# Altium integrated library AnalogDevices.IntLib: 130 symbols (part 4 of 4) (continued)
## ADuM5201CRWZ (continued)
text: A/B; 5201

## CMP04FS
designator D?
CMP04FS Quad Low Power Precision Comparator; Manufacturer: Analog Devices; Type: Микросхема; SymAuthor: Москалец (Юрганов); Name: *; TU/GOST: *; BCPId: *; Package: 14-Lead SOIC, R14/SO-14; Rem: *; ManufacturerPartNumber: CMP04FS
footprint SOIC127P600X175-14N (SOIC, 14-Leads, Body 8.7x3.9mm, Pitch 1.27mm, IPC Medium Density)
part A pins: 2 OUT1 (out) "OUTPUT1", 4 IN1- (in) "INVERTING INPUT1", 5 IN1+ (in) "NONINVERTING INPUT1"
part B pins: 1 OUT2 (out) "OUTPUT2", 6 IN2- (in) "INVERTING INPUT2", 7 IN2+ (in) "NONINVTRTING INPUT2"
part C pins: 3 V+ (power) "POSITIVE SUPPLY", 8 IN3- (in) "INVERTING INPUT3", 9 IN3+ (in) "NONINVERTING INPUT3", 12 GND (power) "GROUND SUBSTRATE", 14 OUT3 (out) "OUTPUT3"
part D pins: 10 IN4- (in) "INVERTING INPUT4", 11 IN4+ (in) "NONINVERTING INPUT4", 13 OUT4 (out) "OUTPUT4"

## HMC194AMS8E
designator D?  (value not drawn)
RF Switch; Manufacturer: Analog Devices; Type: Микросхема; ManufacturerPartNumber: HMC194AMS8E
footprint TSOP65P490X110-8N (TSOP, 8-Leads, Body 3,00x3,00mm, Pitch 0,65mm, IPC Medium Density)
pins: 1 A (io), 2 B (io), 3 RFС (io), 4 NC (io), 5 RF1 (io), 6 GND (power), 7 GND (power), 8 RF2 (io)
text: SW; HMC194

## HMC646LP2
designator D?  (value not drawn)
GaAs MMIC 40W FAILSAFE  SWITCH, 0.1 - 2.1 GHz; Manufacturer: Analog Devices; ManufacturerPartNumber: HMC646LP2; Type: Микросхема; Package: DFN 2x2mm
footprint DFN200X200X100_HS-7N-85x145 (DFN, 6-Leads, Body 2,00x2,00mm, Pitch 0,65mm, Thermal Pad 0,80x1,40mm, IPC Medium Density)
pins: 1 Tx (power), 2 N/C, 3 ACG (power), 4 Rx (power), 5 Vctl (power), 6 RFC (io), EPAD GND (power) hidden to GND
text: SW; HMC646; LP2

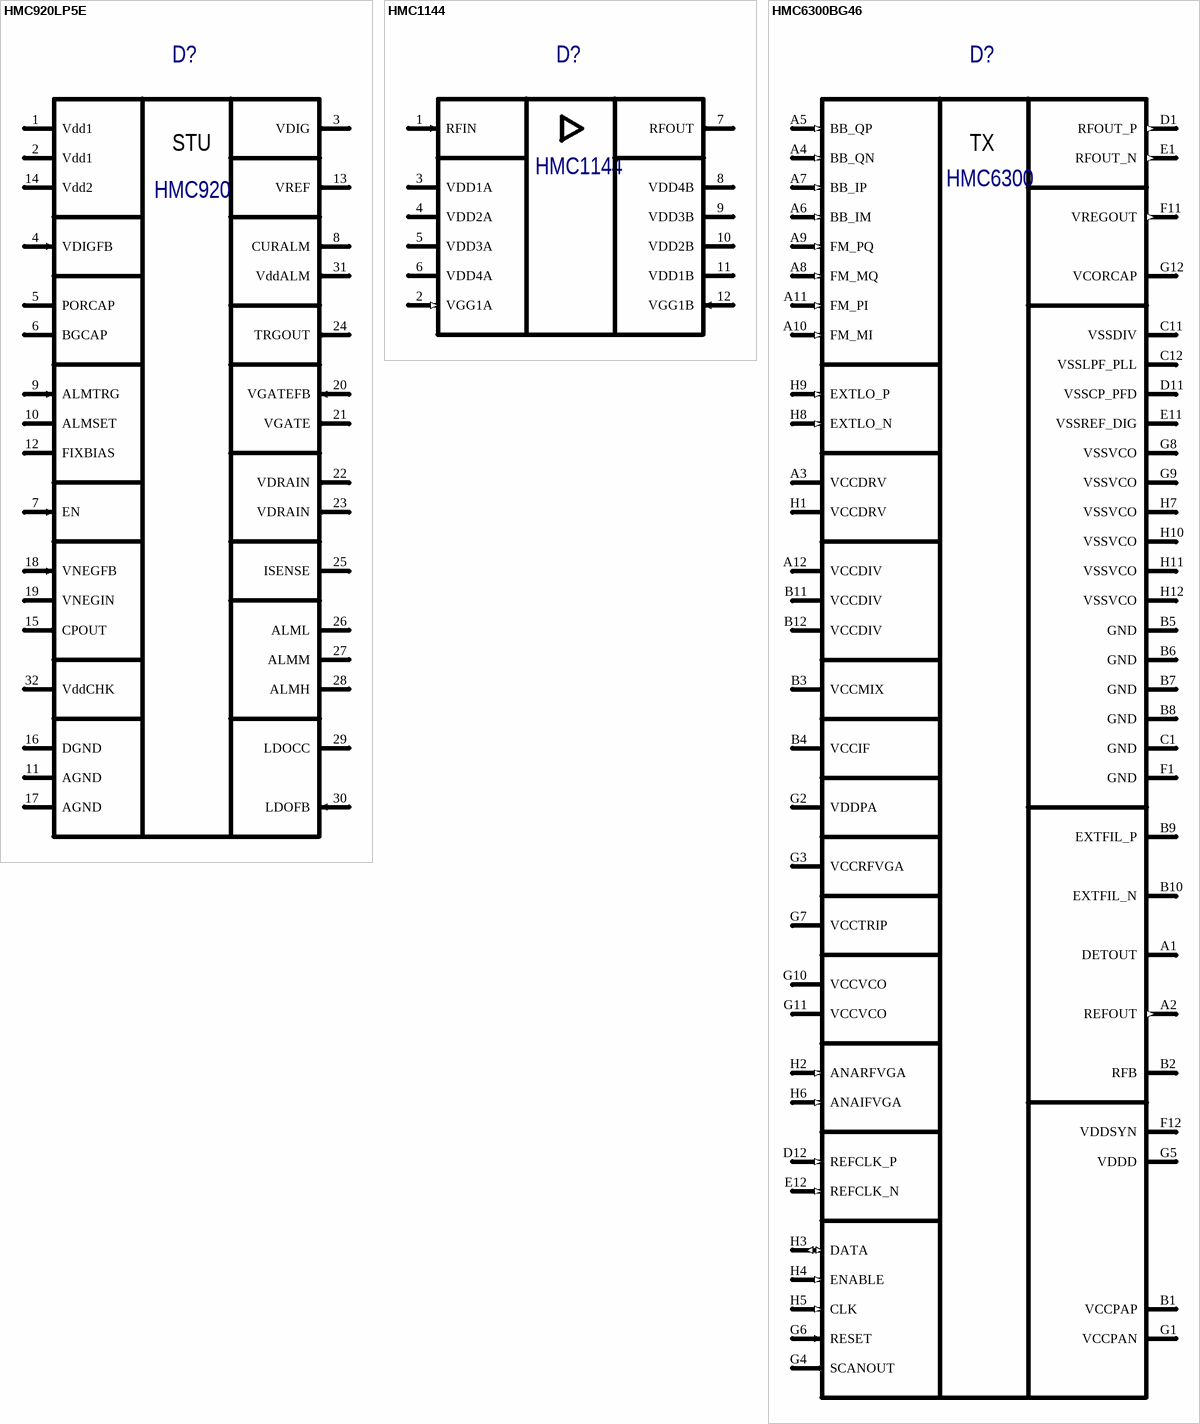
[diagram p19: symbols HMC920LP5E to HMC6300BG46]

## HMC920LP5E
designator D?  (value not drawn)
Active bias controller; Manufacturer: Analog Devices; Type: Микросхема; SymAuthor: Таран А. Н.; ManufacturerPartNumber: HMC920LP5E; Package: 5,0х5,0х0,9 мм QFN
footprint QFN50P500X500X100_HS380x380-33N (QFN, 32-Leads, Body 5,00x5,00mm, Pitch 0,50mm, Thermal Pad 3,80x3,80mm, IPC Medium Density)
pins: 1 Vdd1 (power) "Bias supply Pin.", 2 Vdd1 (power) "Bias supply Pin.", 3 VDIG (out) "3.5V LDO output for internal use.", 4 VDIGFB (in) "Feedback node for VDIG LDO.", 5 PORCAP "External capacitor for power-on-reset signal.", 6 BGCAP "External capacitor of bandgap output.", 7 EN (in) "Enable pin.", 8 CURALM (out) "Over/under current alarm.", 9 ALMTRG (in) "Dummy alarm trigger signal.", 10 ALMSET "Alarm delay duration set resistor.", 11 AGND (power) "Analog ground domain (GND).", 12 FIXBIAS "Bias current set resistor.", 13 VREF (out) "1.5V reference voltage.", 14 Vdd2 (power) "Bias supply for negative voltage generator.", 15 CPOUT (out) "Negative voltage generator charge pump output.", 16 DGND (power) "Digital ground domain (DGND).", 17 AGND (power) "Analog ground domain (GND).", 18 VNEGFB (in) "Feedback (Control) pin for Negative Voltage Generator", 19 VNEGIN (power) "Negative input to the chip.", 20 VGATEFB (in) "Control pin for VGATEFB.", 21 VGATE (out) "Gate Control pin for external amplifier.", 22 VDRAIN (out) "Drain voltage.", 23 VDRAIN (out) "Drain voltage.", 24 TRGOUT (out) "Trigger out signal.", 25 ISENSE "Bias current of the external amplifier adjust resistor pin.", 26 ALML "the threshold value for under current alarm set resistor.", 27 ALMM "The threshold value for under current alarm set resistor.", 28 ALMH "The threshold value for under current alarm set resistor.", 29 LDOCC (power) "High voltage LDO output pin.", 30 LDOFB (in) "Feedback pin of the VDRAIN LDO.", 31 VddALM (out) "Generates an active LOW signal if Vdd1 drops below 3.5V.", 32 VddCHK "Should be left floating for regular operation.", EPAD GND PAD hidden to GND "Analog ground (AGND)."
text: STU; HMC920

## HMC1144
designator D?  (value not drawn)
35 GHz to 70 GHz, GaAs, pHEMT, MMIC, Medium Power Amplifier; Manufacturer: Analog Devices; SymAuthor: Таран А. Н.; Type: Микросхема; ManufacturerPartNumber: HMC1144; Package: 12-Pad Bare Die [CHIP]
footprint C-12-2
pins: 1 RFIN (in) "RF Input.", 2 VGG1A (in) "Gate Control Pad for Alternate Bias Configuration.", 3 VDD1A (power) "Drain Bias Voltage Pads for the Amplifier.", 4 VDD2A (power) "Drain Bias Voltage Pads for the Amplifier.", 5 VDD3A (power) "Drain Bias Voltage Pads for the Amplifier.", 6 VDD4A (power) "Drain Bias Voltage Pads for the Amplifier.", 7 RFOUT (out) "RF Output.", 8 VDD4B (power) "Drain Bias Voltage Pads for Alternate Bias Configuration.", 9 VDD3B (power) "Drain Bias Voltage Pads for Alternate Bias Configuration.", 10 VDD2B (power) "Drain Bias Voltage Pads for Alternate Bias Configuration.", 11 VDD1B (power) "Drain Bias Voltage Pads for Alternate Bias Configuration.", 12 VGG1B (in) "Gate Control Pad for the Amplifier."

## HMC6300BG46
designator D?  (value not drawn)
60 GHz Millimeterwave Transmitter, 57 GHz to 64 GHz; Manufacturer: Analog Devices; SymAuthor: Таран А. Н.; Type: Микросхема; ManufacturerPartNumber: HMC6300BG46; Package: 65-Ball Wafer Level Ball Grid Array [WLBGA] (BF-65-1)
footprint BGA65C50P8X12_600X400X815 (BGA, 65-Leads, Body 6x4mmx0,815mm, Pitch 0,50mm)
pins: A1 DETOUT (power) "Detector Output (0.6 V dc to 2.6 V dc).", A2 REFOUT (out) "Detector Reference Output (0.6 V dc).", A3 VCCDRV (power) "Driver Power Supply (2.7 V dc).", A4 BB_QN (in) "Quadrature Negative Baseband Input.", A5 BB_QP (in) "Quadrature Positive Baseband Input.", A6 BB_IM (in) "In-Phase Negative Baseband Input.", A7 BB_IP (in) "In-Phase Positive Baseband Input.", A8 FM_MQ (in) "FSK Negative (Minus) Quadrature Input.", A9 FM_PQ (in) "FSK Positive Quadrature Input.", A10 FM_MI (in) "FSK Negative (Minus) In-Phase Input.", A11 FM_PI (in) "FSK Positive In-Phase Input.", A12 VCCDIV (power) "Divider Power Supply (2.7 V dc).", B1 VCCPAP (power) "Power Amplifier Power Supply (4.0 V dc).", B2 RFB "Detector Circuit Feedback.", B3 VCCMIX (power) "Mixer Power Supply (2.7 V dc).", B4 VCCIF (power) "IF Power Supply (2.7 V dc).", B5 GND (power) "Analog Ground Connect.", B6 GND (power) "Analog Ground Connect.", B7 GND (power) "Analog Ground Connect.", B8 GND (power) "Analog Ground Connect.", B9 EXTFIL_P "External PLL Filter (Positive).", B10 EXTFIL_N "External PLL Filter (Negative).", B11 VCCDIV (power) "Divider Power Supply (2.7 V dc).", B12 VCCDIV (power) "Divider Power Supply (2.7 V dc).", C1 GND (power) "Analog Ground Connect.", C11 VSSDIV (power) "Digital Ground for the Synthesizer.", C12 VSSLPF_PLL (power) "Digital Ground for Synthesizer.", D1 RFOUT_P (out) "Radio Frequency Output (Positive).", D11 VSSCP_PFD (power) "Digital Ground for Synthesizer.", D12 REFCLK_P (in) "External Reference Clock (Positive).", E1 RFOUT_N (out) "Radio Frequency Output (Negative).", E11 VSSREF_DIG (power) "Digital Ground for Synthesizer.", E12 REFCLK_N (in) "External Reference Clock (Negative).", EPAD1 GND (power) hidden to GND "GROUND AREA", EPAD2 GND (power) hidden to GND "GROUND AREA", EPAD3 GND (power) hidden to GND "GROUND AREA", EPAD4 GND (power) hidden to GND "GROUND AREA", EPAD5 GND (power) hidden to GND "GROUND AREA", F1 GND (power) "Analog Ground Connect.", F11 VREGOUT (out) "VCO Regulator Output.", F12 VDDSYN (power) "Synthesizer Power Supply (1.3 V dc).", G1 VCCPAN (power) "Power Amplifier Power Supply (4.0 V dc).", G2 VDDPA (power) "Power Amplifier Power Supply (2.7 V dc).", G3 VCCRFVGA (power) "RF VGA Power Supply (2.7 V dc).", G4 SCANOUT (out) "Serial Digital Interface Output (1.2 V CMOS).", G5 VDDD (power) "Digital Circuits Power Supply (1.3 V dc).", G6 RESET (in) "Serial Digital Interface Reset (1.2 V CMOS).", G7 VCCTRIP (power) "Tripler Power Supply (2.7 V dc).", G8 VSSVCO (power) "Digital Ground for the VCO.", G9 VSSVCO (power) "Digital Ground for the VCO.", G10 VCCVCO (power) "VCO Power Supply (2.7 V dc).", G11 VCCVCO (power) "VCO Power Supply (2.7 V dc).", G12 VCORCAP "External Capacitor Connection for the VCO Regulator.", H1 VCCDRV (power) "Driver Power Supply (2.7 V dc).", H2 ANARFVGA (in) "0.1 V to 2.4 V RF VGA Analog Control.", H3 DATA (io) "Serial Digital Interface Data (1.2 V CMOS).", H4 ENABLE (in) "Serial Digital Interface Enable (1.2 V CMOS).", H5 CLK (in) "Serial Digital Interface Clock (1.2 V CMOS).", H6 ANAIFVGA (in) "0.1 V to 2.4 V IF VGA Analog Control.", H7 VSSVCO (power) "Digital Ground for the VCO.", H8 EXTLO_N (in) "External LO (Negative) Input.", H9 EXTLO_P (in) "External LO (Positive) Input.", H10 VSSVCO (power) "Digital Ground for the VCO.", H11 VSSVCO (power) "Digital Ground for the VCO.", H12 VSSVCO (power) "Digital Ground for the VCO."
text: TX; HMC6300

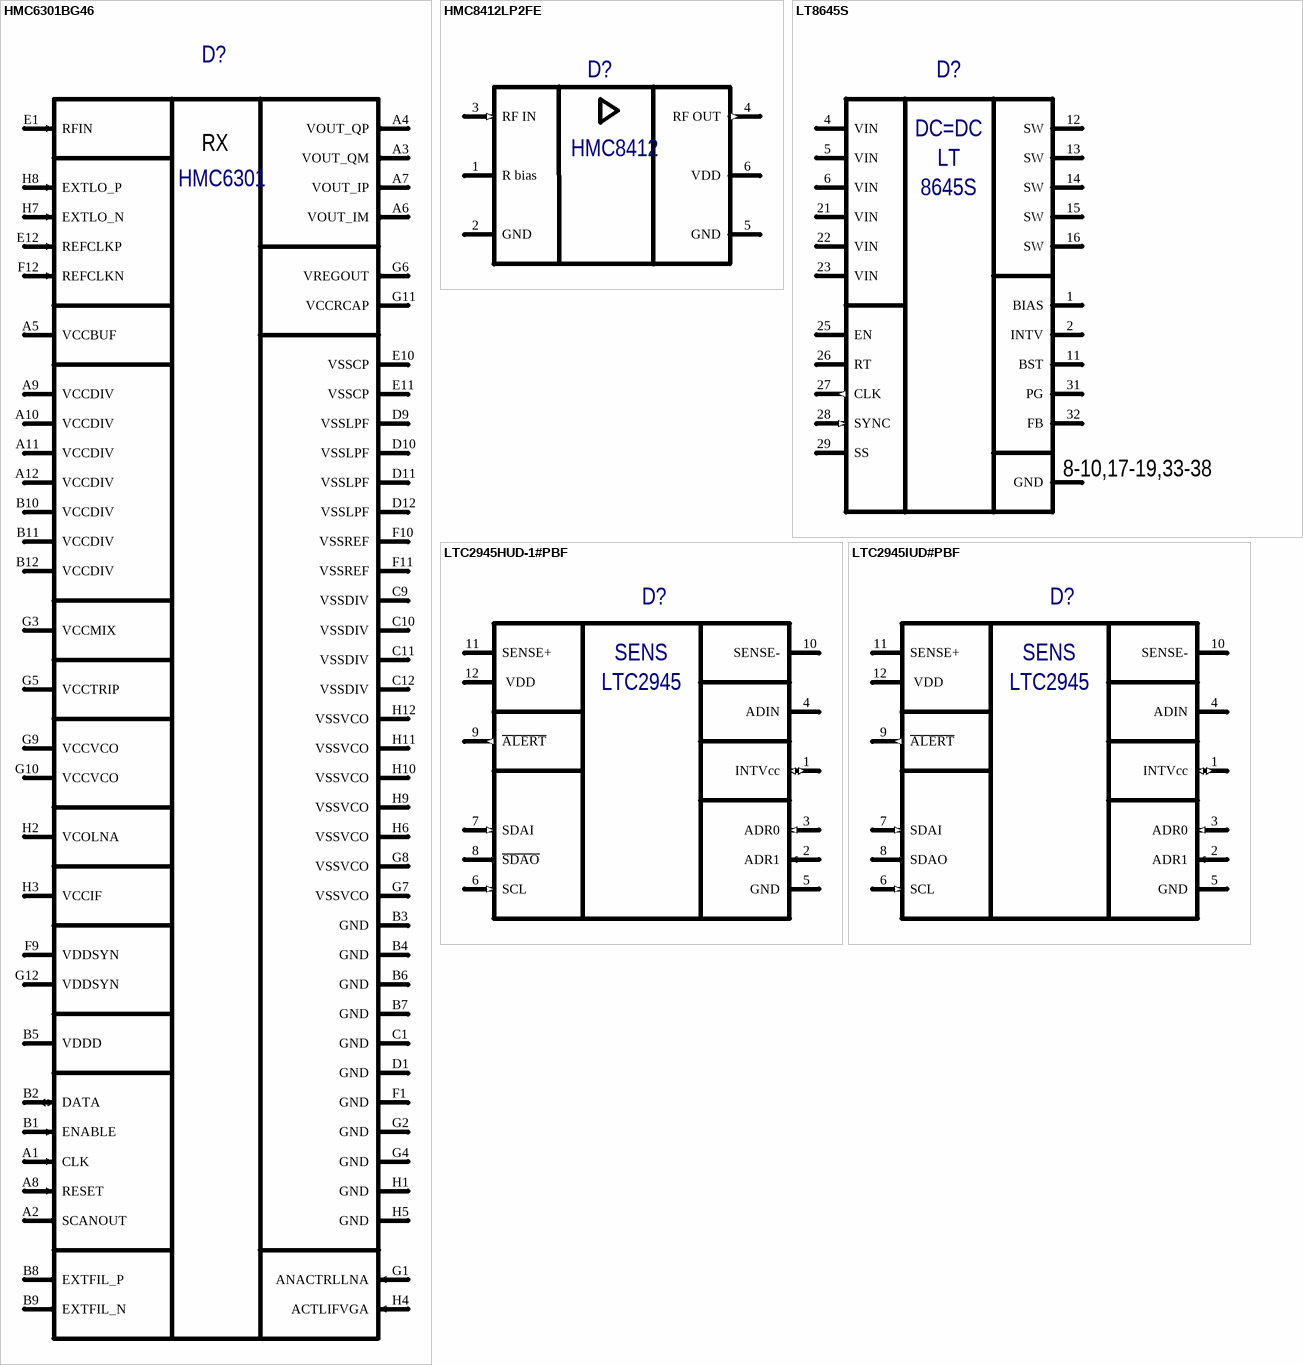
[diagram p20: symbols HMC6301BG46 to LTC2945IUD#PBF]

## HMC6301BG46
designator D?  (value not drawn)
Millimeterwave Receiver, 57 GHz to 64 GHz; Manufacturer: Analog Devices; SymAuthor: Таран А.Н.; Type: Микросхема; ManufacturerPartNumber: HMC6301BG46; Package: 75-Ball WLBGA (BF-75-1)
footprint BGA75C50P8X12_600X400X815 (BGA, 75-Leads, Body 6x4mmx0,815mm, Pitch 0,50mm)
pins: A1 CLK (in) "Serial Digital Interface Clock (1.2 V CMOS).", A2 SCANOUT (out) "Serial Digital Interface Out (1.2 V CMOS).", A3 VOUT_QM (out) "Quadrature Negative Baseband Output.", A4 VOUT_QP (out) "Quadrature Positive Baseband Output.", A5 VCCBUF (power) "Power Supply for the Buffer (2.7 V dc).", A6 VOUT_IM (out) "In-Phase Negative Baseband Output.", A7 VOUT_IP (out) "In-Phase Positive Baseband Output.", A8 RESET (in) "Serial Digital Interface Reset (1.2 V CMOS).", A9 VCCDIV (power) "Power Supply for the Divider (2.7 V dc).", A10 VCCDIV (power) "Power Supply for the Divider (2.7 V dc).", A11 VCCDIV (power) "Power Supply for the Divider (2.7 V dc).", A12 VCCDIV (power) "Power Supply for the Divider (2.7 V dc).", B1 ENABLE (in) "Serial Digital Interface Enable (1.2 V CMOS).", B2 DATA (io) "Serial Digital Interface Data (1.2 V CMOS).", B3 GND (power) "Analog Ground Connect.", B4 GND (power) "Analog Ground Connect.", B5 VDDD (power) "Power Supply for the Digital Circuits (1.3 V dc).", B6 GND (power) "Analog Ground Connect.", B7 GND (power) "Analog Ground Connect.", B8 EXTFIL_P (out) "External PLL Loop Filter (Positive).", B9 EXTFIL_N (out) "External PLL Loop Filter (Positive).", B10 VCCDIV (power) "Power Supply for the Divider (2.7 V dc).", B11 VCCDIV (power) "Power Supply for the Divider (2.7 V dc).", B12 VCCDIV (power) "Power Supply for the Divider (2.7 V dc).", C1 GND (power) "Analog Ground Connect.", C9 VSSDIV (power) "Digital Ground for the Synthesizer Divider.", C10 VSSDIV (power) "Digital Ground for the Synthesizer Divider.", C11 VSSDIV (power) "Digital Ground for the Synthesizer Divider.", C12 VSSDIV (power) "Digital Ground for the Synthesizer Divider.", D1 GND (power) "Analog Ground Connect.", D9 VSSLPF (power) "Digital Ground for the Synthesizer Low-Pass Filter.", D10 VSSLPF (power) "Digital Ground for the Synthesizer Low-Pass Filter.", D11 VSSLPF (power) "Digital Ground for the Synthesizer Low-Pass Filter.", D12 VSSLPF (power) "Digital Ground for the Synthesizer Low-Pass Filter.", E1 RFIN (in) "Radio Frequency Input.", E10 VSSCP (power) "Digital Ground for the Synthesizer Charge Pump.", E11 VSSCP (power) "Digital Ground for the Synthesizer Charge Pump.", E12 REFCLKP (in) "External Reference Clock (Positive).", EPAD1 GND (power) hidden to GND "GROUND AREA", EPAD2 GND (power) hidden to GND "GROUND AREA", EPAD3 GND (power) hidden to GND "GROUND AREA", EPAD4 GND (power) hidden to GND "GROUND AREA", EPAD5 GND (power) hidden to GND "GROUND AREA", EPAD6 GND (power) hidden to GND "GROUND AREA", EPAD7 GND (power) hidden to GND "GROUND AREA", EPAD8 GND (power) hidden to GND "GROUND AREA", F1 GND (power) "Analog Ground Connect.", F9 VDDSYN (power) "Power Supply for the Synthesizer (1.3 V dc).", F10 VSSREF (power) "Digital Ground for the Synthesizer Reference.", F11 VSSREF (power) "Digital Ground for the Synthesizer Reference.", F12 REFCLKN (in) "External Reference Clock (Negative).", G1 ANACTRLLNA (in) "Analog Gain Control for the Low Noise Amplifier.", G2 GND (power) "Analog Ground Connect.", G3 VCCMIX (power) "Power Supply for the Mixer (2.7 V dc).", G4 GND (power) "Analog Ground Connect.", G5 VCCTRIP (power) "Power Supply for the Tripler (2.7 V dc).", G6 VREGOUT (out) "Regulator Output for the Voltage Controlled Oscillator.", G7 VSSVCO (power) "Digital Ground to the Synthesizer Voltage Controlled Oscillator.", G8 VSSVCO (power) "Digital Ground to the Synthesizer Voltage Controlled Oscillator.", G9 VCCVCO (power) "Power Supply for the Voltage Controlled Oscillator (2.7 V dc).", G10 VCCVCO (power) "Power Supply for the Voltage Controlled Oscillator (2.7 V dc).", G11 VCCRCAP "External Capacitor Connection for the Voltage Controlled Oscillator Regulator.", G12 VDDSYN (power) "Power Supply for the Synthesizer (1.3 V dc).", H1 GND (power) "Analog Ground Connect.", H2 VCOLNA (power) "Power Supply for the Low Noise Amplifier (2.8 V dc).", H3 VCCIF (power) "Power Supply for the Intermediate Frequency (2.8 V dc).", H4 ACTLIFVGA (in) "Analog Gain Control for the IF Variable Gain Amplifier.", H5 GND (power) "Analog Ground Connect.", H6 VSSVCO (power) "Digital Ground to the Synthesizer Voltage Controlled Oscillator.", H7 EXTLO_N (in) "External Local Oscillator (Negative) Input.", H8 EXTLO_P (in) "External Local Oscillator (Positive) Input.", H9 VSSVCO (power) "Digital Ground to the Synthesizer Voltage Controlled Oscillator.", H10 VSSVCO (power) "Digital Ground to the Synthesizer Voltage Controlled Oscillator.", H11 VSSVCO (power) "Digital Ground to the Synthesizer Voltage Controlled Oscillator.", H12 VSSVCO (power) "Digital Ground to the Synthesizer Voltage Controlled Oscillator."
text: RX; HMC6301

## HMC8412LP2FE
designator D?  (value not drawn)
Low Noise Amplifier,  0.4 GHz to 11 GHz; Manufacturer: Analog Devices; Type: Микросхема; BCPId: *; Name: *; Package: CP-6-12; ManufacturerPartNumber: HMC8412LP2FE
footprint SON65P200X90_HS-7N (SON, 6-Leads, Body 2,00x2,00mm, Pitch 0,65mm, Thermal Pad 1,60x1mm, IPC Medium Density)
pins: 1 R bias (power) "Current Mirror Bias Resistor Pin", 2 GND (power) "Ground", 3 RF IN (in), 4 RF OUT (out) "RF OUT / Vdd", 5 GND (power), 6 VDD (power), EPAD GND (power) hidden to GND "Paddle"
text: HMC8412

## LT8645S
designator D?, comment LT8645SEV#PBF  (value not drawn)
65V, 8A Synchronous  Step-Down Silent Switcher 2; Manufacturer: Analog Devices; Type: Микросхема; SymAuthor: Блохин В.А,; BCPId: *; Name: *; Package: LQFN 6x4; ManufacturerPartNumber: LT8645SEV#PBF
footprint LQFN50P600X400X94-32N (32-Lead SMD; Body: L=6mm, W=4mm, H=0.94mm; Weight: ~2g)
pins: 1 BIAS (power) "The internal regulator", 2 INTV (power) "Internal 3.4V Regulator Bypass Pin", 3 NC hidden to GND, 4 VIN (power) "V IN pin", 5 VIN (power) "V IN pin", 6 VIN (power) "V IN pin", 7 NC hidden to GND, 8 GND (power) "Ground", 9 GND (power) hidden to GND "Ground", 10 GND (power) hidden to GND "Ground", 11 BST (power) "drive voltage", 12 SW (power) "Power Output", 13 SW (power) "Power Output", 14 SW (power) "Power Output", 15 SW (power) "Power Output", 16 SW (power) "Power Output", 17 GND (power) hidden to GND "Ground", 18 GND (power) hidden to GND "Ground", 19 GND (power) hidden to GND "Ground", 20 NC hidden to GND, 21 VIN (power) "V IN pin", 22 VIN (power) "V IN pin", 23 VIN (power) "V IN pin", 24 NC hidden to GND, 25 EN (power) "shut down", 26 RT (power) "switching frequency", 27 CLK (out) "In pulse-skipping mode", 28 SYNC (in) "operating modes", 29 SS (power) "Soft-Start", 30 GND (power) hidden to GND, 31 PG (power) "power good", 32 FB (power) "feedback", 33 EPAD (power) hidden to GND "Exposed Pad Ground", 34 EPAD (power) hidden to GND "Exposed Pad Ground", 35 EPAD (power) hidden to GND "Exposed Pad Ground", 36 EPAD (power) hidden to GND "Exposed Pad Ground", 37 EPAD (power) hidden to GND "Exposed Pad Ground", 38 EPAD (power) hidden to GND "Exposed Pad Ground", 39 GND (power) hidden to GND, 40 GND (power) hidden to GND, 41 GND (power) hidden to GND, 42 GND (power) hidden to GND
text: DC=DC; LT; 8645S; 8-10,17-19,33-38

## LTC2945HUD-1#PBF
designator D?  (value not drawn)
Wide Range I2C Power Monitor; Manufacturer: Analog Devices; Type: Микросхема; SymAuthor: Гришин Е.; ManufacturerPartNumber: LTC2945HUD-1#PBF; Package: 12-Lead (3mm x 3mm) Plastic QFN
footprint QFN50P300X300X80_HS165X165-13N (QFN, 12-Leads, Body 3,0x3,0mm, Pitch 0,50mm, Thermal Pad 1,65x1,65mm, IPC Medium Density)
pins: 1 INTVcc (io) "Internal Low Voltage Supply Input/Output", 2 ADR1 (in) "I2C Device Adress Inputs", 3 ADR0 (in) "I2C Device Adress Inputs", 4 ADIN "ADC Input", 5 GND (power) "Device Ground", 6 SCL (in) "I2C Bus Clock Input", 7 SDAI (in) "I2C Bus Data Input", 8 ~{SDAO} (out) "I2C Bus Data Output", 9 ~{ALERT} (out) "Fault Alert Output", 10 SENSE- (power) "Current Sense Input. Connect an external sense resistor between SENSE+ and SENSE-", 11 SENSE+ (power) "Supply Voltage and Current Sense Input", 12  VDD (power) "High Voltage Supply Input", EPAD (power) hidden to GND "Exposed Pad connected to GND"
text: SENS; LTC2945

## LTC2945IUD#PBF
designator D?  (value not drawn)
Wide Range I2C Power Monitor; Manufacturer: Analog Devices; Type: Микросхема; SymAuthor: Приходченко А.И.; ManufacturerPartNumber: LTC2945IUD#PBF; Package: 12-Lead (3mm x 3mm) Plastic QFN
footprint QFN50P300X300X80_HS165X165-13N (QFN, 12-Leads, Body 3,0x3,0mm, Pitch 0,50mm, Thermal Pad 1,65x1,65mm, IPC Medium Density)
pins: 1 INTVcc (io) "Internal Low Voltage Supply Input/Output", 2 ADR1 (in) "I2C Device Adress Inputs", 3 ADR0 (in) "I2C Device Adress Inputs", 4 ADIN "ADC Input", 5 GND (power) "Device Ground", 6 SCL (in) "I2C Bus Clock Input", 7 SDAI (in) "I2C Bus Data Input", 8 SDAO (out) "I2C Bus Data Output", 9 ~{ALERT} (out) "Fault Alert Output", 10 SENSE- (power) "Current Sense Input. Connect an external sense resistor between SENSE+ and SENSE-", 11 SENSE+ (power) "Supply Voltage and Current Sense Input", 12  VDD (power) "High Voltage Supply Input", EPAD (power) hidden to GND "Exposed Pad connected to GND"
text: SENS; LTC2945

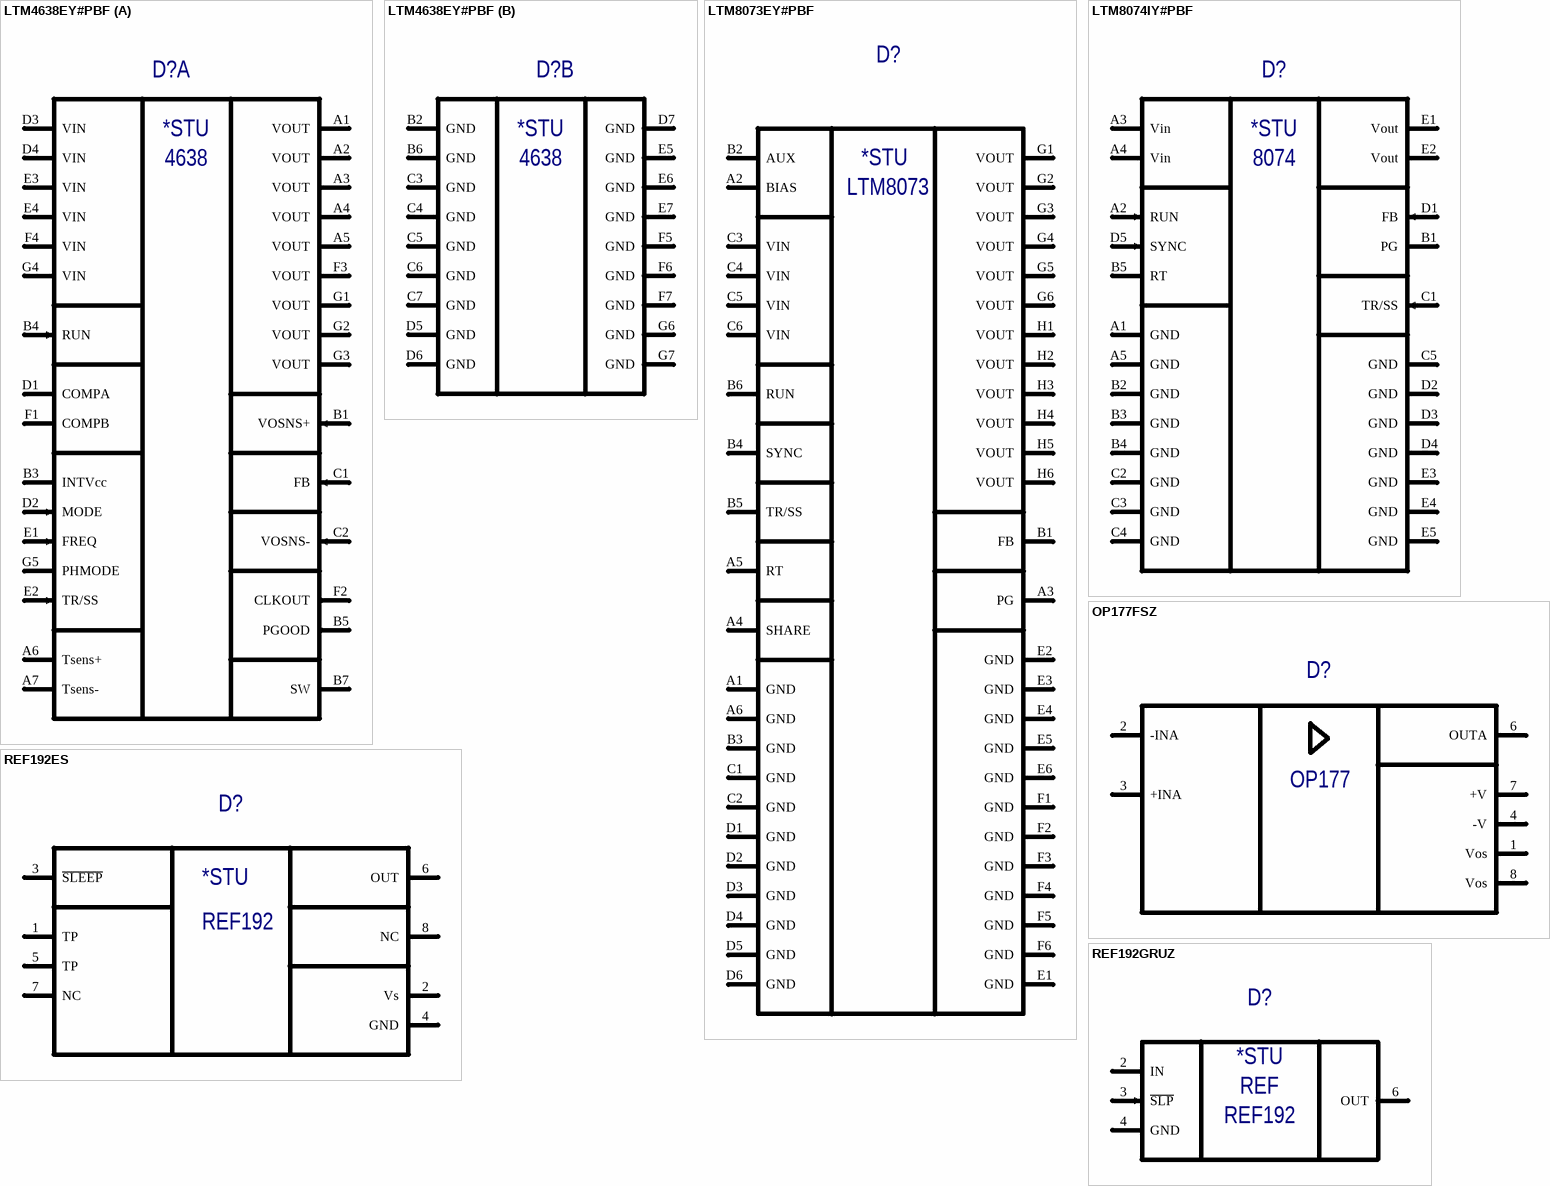
[diagram p21: symbols LTM4638EY#PBF to REF192GRUZ]

## LTM4638EY#PBF
designator D?  (value not drawn)
20Vin, 15A Step-Down DC/DC µModule Regulator; Manufacturer: Linear Technology; Type: Микросхема; SymAuthor: Ерешко П.А.; Package: BGA-49; ManufacturerPartNumber: LTM4638EY#PBF
footprint BGA49C80P7X7_625X625X536 (BGA, 49-Leads, Body 6,25x6,25mmx5,36mm, Pitch 0,80mm)
part A pins: A1 VOUT (power) "Power Output Pins", A2 VOUT (power) "Power Output Pins", A3 VOUT (power) "Power Output Pins", A4 VOUT (power) "Power Output Pins", A5 VOUT (power) "Power Output Pins", A6 Tsens+ "Temperature Monitor", A7 Tsens- "Temperature Monitor", B1 VOSNS+ (in) "Input to the Remote Sense Amplifier", B3 INTVcc (power) "Internal 3.3V LDO", B4 RUN (in) "Run Control Pin", B5 PGOOD (out) "Output Voltage Power Good Indicator", B7 SW "Switching node of the circuit is used for testing purposes", C1 FB (in) "The Negative Input of the Error Amplifier", C2 VOSNS- (in) "Input to the Remote Sense Amplifier", D1 COMPA "Current Control Threshold and Error Amplifier Compensation Point", D2 MODE (in) "Discontinuous Mode Select Pin and External Synchronization Input to Phase Detector", D3 VIN (power) "Power Input Pins", D4 VIN (power) "Power input pins", E1 FREQ (in) "Set the operating frequency", E2 TR/SS (in) "Output Voltage Tracking Pin and Soft-Start", E3 VIN (power) "Power input pins", E4 VIN (power) "Power input pins", F1 COMPB "Internal Loop Compensation Networks", F2 CLKOUT (out) "Output Clock  Signal for PolyPhase Operation", F3 VOUT (power) "Power Output Pins", F4 VIN (power) "Power input pins", G1 VOUT (power) "Power Output Pins", G2 VOUT (power) "Power Output Pins", G3 VOUT (power) "Power Output Pins", G4 VIN (power) "Power input pins", G5 PHMODE "Control Input to the Phase Selector"
part B pins: B2 GND (power) "Power Ground Pins", B6 GND (power) "Power Ground Pins", C3 GND (power) "Power Ground Pins", C4 GND (power) "Power Ground Pins", C5 GND (power) "Power Ground Pins", C6 GND (power) "Power Ground Pins", C7 GND (power) "Power Ground Pins", D5 GND (power) "Power Ground Pins", D6 GND (power) "Power Ground Pins", D7 GND (power) "Power Ground Pins", E5 GND (power) "Power Ground Pins", E6 GND (power) "Power Ground Pins", E7 GND (power) "Power Ground Pins", F5 GND (power) "Power Ground Pins", F6 GND (power) "Power Ground Pins", F7 GND (power) "Power Ground Pins", G6 GND (power) "Power Ground Pins", G7 GND (power) "Power Ground Pins"
part A text: *STU; 4638
part B text: *STU; 4638

## LTM8073EY#PBF
designator D?  (value not drawn)
Стабилизатор напряжений; Manufacturer: Analog Devices; Type: Микросхема; ManufacturerPartNumber: LTM8073EY#PBF; Package: *
footprint BGA48C100P6X8_625X900X352 (BGA, 48-Leads, Body 6,25x9,00mmx3,52mm, Pitch 1,00mm)
pins: A1 GND (power), A2 BIAS, A3 PG, A4 SHARE, A5 RT, A6 GND (power), B1 FB, B2 AUX, B3 GND (power), B4 SYNC, B5 TR/SS, B6 RUN, C1 GND (power), C2 GND (power), C3 VIN (power), C4 VIN (power), C5 VIN (power), C6 VIN, D1 GND (power), D2 GND (power), D3 GND (power), D4 GND (power), D5 GND (power), D6 GND (power), E1 GND (power), E2 GND (power), E3 GND (power), E4 GND (power), E5 GND (power), E6 GND (power), F1 GND (power), F2 GND (power), F3 GND (power), F4 GND (power), F5 GND (power), F6 GND (power), G1 VOUT (power), G2 VOUT (power), G3 VOUT (power), G4 VOUT (power), G5 VOUT (power), G6 VOUT (power), H1 VOUT (power), H2 VOUT (power), H3 VOUT (power), H4 VOUT (power), H5 VOUT (power), H6 VOUT (power)
text: *STU; LTM8073

## LTM8074IY#PBF
designator D?  (value not drawn)
40Vin, 1.2A Silent Switcher µModule Regulator; Manufacturer: Analog Devices; Type: Микросхема; Package: BGA-25; ManufacturerPartNumber: LTM8074IY#PBF
footprint BGA25C65P5X5_400X400X198 (BGA, 25-Leads, 5 columns X 5 rows, Body 4,00x4,00mmx1,98mm, Pitch 0,65mm)
pins: A1 GND (power) "Power Ground", A2 RUN (in) "Pull the RUN pin below 0.9V to shut down", A3 Vin (power) "Vin supplies current to the LTM8074’s internal regulator and to the internal power switches", A4 Vin (power) "Vin supplies current to the LTM8074’s internal regulator and to the internal power switches", A5 GND (power) "Power Ground", B1 PG (oc) "Output Power Good", B2 GND (power) "Power Ground", B3 GND (power) "Power Ground", B4 GND (power) "Power Ground", B5 RT "The RT pin is used to program the switching", C1 TR/SS (in) "The TR/SS pin is used to provide a softstart or tracking function", C2 GND (power) "Power Ground", C3 GND (power) "Power Ground", C4 GND (power) "Power Ground", C5 GND (power) "Power Ground", D1 FB (in) "The LTM8074 regulates its FB pin to 0.774V", D2 GND (power) "Power Ground", D3 GND (power) "Power Ground", D4 GND (power) "Power Ground", D5 SYNC (in) "External clock synchronization input and", E1 Vout (power) "Power Output", E2 Vout (power) "Power Output", E3 GND (power) "Power Ground", E4 GND (power) "Power Ground", E5 GND (power) "Power Ground"
text: *STU; 8074

## OP177FSZ
designator D?  (value not drawn)
Ultraprecision Operational Amplifier; Manufacturer: Analog Devices; Type: Микросхема; BCPId: *; Name: *; Package: R-8; ManufacturerPartNumber: OP177FSZ
footprint SOIC127P600-8M (SOIC, 8-Leads, Body 4.9x3.9mm, Pitch 1.27mm, IPC Low Density)
pins: 1 Vos, 2 -INA, 3 +INA, 4 -V, 5 NC hidden, 6 OUTA, 7 +V, 8 Vos
text: OP177

## REF192ES
designator D?  (value not drawn)
Источник опорного напряжения 2,5 В 30 мА; Manufacturer: Analog Devices; Type: Микросхема; BCPId: *; ManufacturerPartNumber: REF192ES; Package: R-8
footprint SOIC127P600-8M (SOIC, 8-Leads, Body 4.9x3.9mm, Pitch 1.27mm, IPC Low Density)
pins: 1 TP, 2 Vs, 3 ~{SLEEP}, 4 GND, 5 TP, 6 OUT, 7 NC, 8 NC
text: *STU; REF192

## REF192GRUZ
designator D?  (value not drawn)
Источник опорного напряжения 2,5 В 30 мА; Manufacturer: Analog Devices; Type: Микросхема; SymAuthor: Семенов В.С,; BCPId: *; ManufacturerPartNumber: REF192GRUZ; Package: RU-8
footprint TSOP65P640X120-8N (TSOP, 8-Leads, Body 6,6x4,5mm (max), Pitch 0,65mm, IPC Medium Density)
pins: 2 IN (power) "Входное питание", 3 ~{SLP} (in) "Инверсный вход установки спящего режима", 4 GND (power) "Земля", 6 OUT (power) "Выходное стабилизированное напряжение 2,5 В"
text: *STU; REF; REF192